# Altium footprint library PCB封装库.PcbLib: 77 footprints (part 2 of 5)
Each footprint in its own frame and in the unit in brackets; x right, y up, seen from the top. Pads: shape width x height; smd on the part's side, far side on the other; paste and mask are expansions set on the pad; w line width, h text height; cw(c..) or ccw(c..) is an arc to the next point about the centre after c.
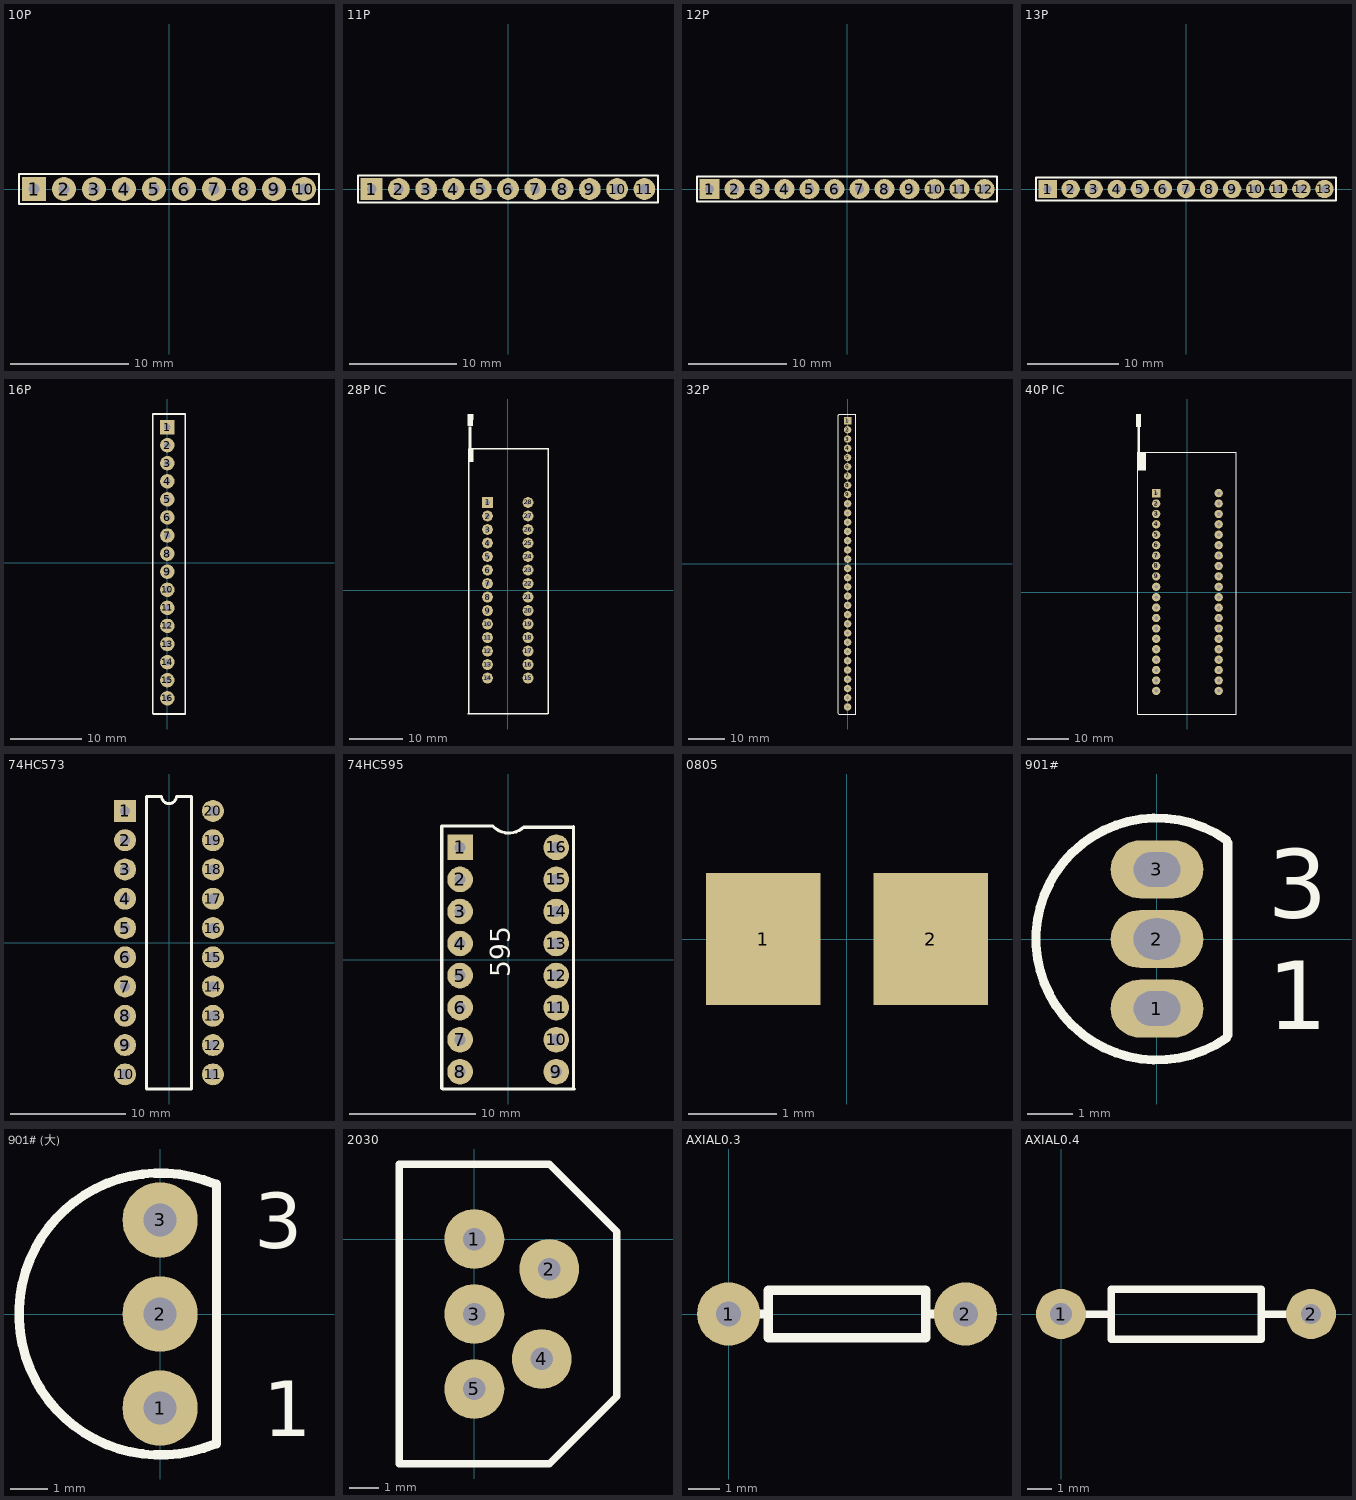
[diagram p1: the footprints below, top view; thin cyan lines are the x and y axes]

## 10P [mil]
pads (10):
  rect 80x80 hole 35.43: 1(-450,0)
  round 80 hole 35.43: 2(-350,0) 3(-250,0) 4(-150,0) 5(-50,0) 6(50,0) 7(150,0) 8(250,0) 9(350,0) 10(450,0)
Top Overlay:
  lines w7.87: -500,-50 -500,50 -425,50 500,50 500,-50 -500,-50

## 11P [mil]
pads (11):
  rect 80x80 hole 35.43: 1(-500,0)
  round 80 hole 35.43: 2(-400,0) 3(-300,0) 4(-200,0) 5(-100,0) 6(0,0) 7(100,0) 8(200,0) 9(300,0) 10(400,0) 11(500,0)
Top Overlay:
  lines w7.87: -550,-50 -550,50 -475,50 550,50 550,-50 -550,-50

## 12P [mil]
pads (12):
  rect 80x80 hole 35.43: 1(-550,0)
  round 80 hole 35.43: 2(-450,0) 3(-350,0) 4(-250,0) 5(-150,0) 6(-50,0) 7(50,0) 8(150,0) 9(250,0) 10(350,0) 11(450,0) 12(550,0)
Top Overlay:
  lines w7.87: -600,-50 -600,50 -525,50 600,50 600,-50 -600,-50

## 13P [mil]
pads (13):
  rect 80x80 hole 35.43: 1(-600,0)
  round 80 hole 35.43: 2(-500,0) 3(-400,0) 4(-300,0) 5(-200,0) 6(-100,0) 7(0,0) 8(100,0) 9(200,0) 10(300,0) 11(400,0) 12(500,0) 13(600,0)
Top Overlay:
  lines w7.87: -650,-50 -650,50 -575,50 650,50 650,-50 -650,-50

## 16P [mil]
pads (16):
  rect 80x80 hole 35: 1(0,750)
  round 80 hole 35: 2(0,650) 3(0,550) 4(0,450) 5(0,350) 6(0,250) 7(0,150) 8(0,50) 9(0,-50) 10(0,-150) 11(0,-250) 12(0,-350) 13(0,-450) 14(0,-550) 15(0,-650) 16(0,-750)
Top Overlay:
  lines w10: -81,-832 -76,-837 99,-837 99,822 -81,822 -81,-832

## 28P IC [mil]
pads (28):
  rect 80x80 hole 35: 1(-150,650)
  round 80 hole 35: 2(-150,550) 3(-150,450) 4(-150,350) 5(-150,250) 6(-150,150) 7(-150,50) 8(-150,-50) 9(-150,-150) 10(-150,-250) 11(-150,-350) 12(-150,-450) 13(-150,-550) 14(-150,-650) 15(150,-650) 16(150,-550) 17(150,-450) 18(150,-350) 19(150,-250) 20(150,-150) 21(150,-50) 22(150,50) 23(150,150) 24(150,250) 25(150,350) 26(150,450) 27(150,550) 28(150,650)
Top Overlay:
  rectangle: -276,951 -255,1049
  rectangle: -281,951 -276,1049
  rectangle: -276,1049 -268,1212
  rectangle: -289,1126 -276,1212
  rectangle: -289,1049 -276,1126
  region: -299.02,1215.5 -256.03,1215.01 -255,1305 -298,1305.49
  lines w10: -296,-916 295,-916 ; -289,-916 -289,1049 302,1049 ; 298,-916 298,1049

## 32P [mil]
pads (32):
  rect 80x80 hole 35: 1(0,1550)
  round 80 hole 35: 2(0,1450) 3(0,1350) 4(0,1250) 5(0,1150) 6(0,1050) 7(0,950) 8(0,850) 9(0,750) 10(0,650) 11(0,550) 12(0,450) 13(0,350) 14(0,250) 15(0,150) 16(0,50) 17(0,-50) 18(0,-150) 19(0,-250) 20(0,-350) 21(0,-450) 22(0,-550) 23(0,-650) 24(0,-750) 25(0,-850) 26(0,-950) 27(0,-1050) 28(0,-1150) 29(0,-1250) 30(0,-1350) 31(0,-1450) 32(0,-1550)
Top Overlay:
  lines w10: -103,-1619 -96,-1626 90,-1626 90,1621 -90,1621 -103,1608 -103,-1619

## 40P IC [mil]
pads (40):
  rect 80x80 hole 35: 1(-300,950)
  round 80 hole 35: 2(-300,850) 3(-300,750) 4(-300,650) 5(-300,550) 6(-300,450) 7(-300,350) 8(-300,250) 9(-300,150) 10(-300,50) 11(-300,-50) 12(-300,-150) 13(-300,-250) 14(-300,-350) 15(-300,-450) 16(-300,-550) 17(-300,-650) 18(-300,-750) 19(-300,-850) 20(-300,-950) 21(300,-950) 22(300,-850) 23(300,-750) 24(300,-650) 25(300,-550) 26(300,-450) 27(300,-350) 28(300,-250) 29(300,-150) 30(300,-50) 31(300,50) 32(300,150) 33(300,250) 34(300,350) 35(300,450) 36(300,550) 37(300,650) 38(300,750) 39(300,850) 40(300,950)
Top Overlay:
  rectangle: -494,1586 -445,1710
  rectangle: -480,1330 -455,1601
  rectangle: -475,1167 -396,1344
  lines w10: -475,-1172 -475,1344 467,1344 467,-1172 -475,-1172

## 74HC573 [mil]
pads (20):
  rect 75x75 hole 35: 1(-150,450)
  round 75 hole 35: 2(-150,350) 3(-150,250) 4(-150,150) 5(-150,50) 6(-150,-50) 7(-150,-150) 8(-150,-250) 9(-150,-350) 10(-150,-450) 11(150,-450) 12(150,-350) 13(150,-250) 14(150,-150) 15(150,-50) 16(150,50) 17(150,150) 18(150,250) 19(150,350) 20(150,450)
Top Overlay:
  lines w10: -77.5,-500 -77.5,500 -25,500 ccw(c0,500) 25,500 77.5,500 77.5,-500 -77.5,-500

## 74HC595 [mil]
pads (16):
  rect 80x80 hole 35: 1(-150,350)
  round 80 hole 35: 2(-150,250) 3(-150,150) 4(-150,50) 5(-150,-50) 6(-150,-150) 7(-150,-250) 8(-150,-350) 9(150,-350) 10(150,-250) 11(150,-150) 12(150,-50) 13(150,50) 14(150,150) 15(150,250) 16(150,350)
Top Overlay:
  lines w10: -208,417 -207,416 -207,-402 -205,-404 207,-404 204,-401 204,415 202,413 48,413 cw(c1.5,463.5) -49,417 -208,417
  text "595" at 5,-56 h60

## 0805 [mm]
pads (2):
  rect 1.3x1.5 smd: 1(-0.95,0) 2(0.95,0)

## 901# [mil]
pads (3):
  oval 80x50 hole 30 slot 40 at 0 deg: 1(0,-60) 3(0,60)
  oval 80x50 hole 35.43 slot 40 at 0 deg: 2(0,0)
Top Overlay:
  lines w7.87: 59.84,-85.46 cw(c0,0) 59.84,85.46 ; 61.02,-82.68 61.02,82.68
  text "3" at 95.31,18.39 h59.05
  text "1" at 95.31,-77.91 h59.05

## 901# (大) [mil]
pads (3):
  round 80 hole 35.43: 1(0,-100) 2(0,0) 3(0,100)
Top Overlay:
  lines w10: 58.58,-138.09 cw(c0,0) 58.58,138.09 ; 60,-138.09 60,138.09
  text "3" at 100,70 h59.05
  text "1" at 110,-130 h59.05

## 2030 [mil]
pads (5):
  round 80 hole 30: 1(0,0) 2(100,-40) 3(0,-100) 4(90,-160) 5(0,-200)
Top Overlay:
  lines w10: -100,-300 100,-300 190,-210 190,10 100,100 -100,100 -100,-300

## AXIAL0.3 [mil]
pads (2):
  round 80 hole 32: 1(0,0) 2(300,0)
Top Overlay:
  lines w12: 41,0 50,0 ; 259,0 250,0 ; 250,0 250,-30 50,-30 50,30 250,30 250,0

## AXIAL0.4 [mil]
pads (2):
  round 80 hole 35: 1(0,0)
  round 80 hole 32: 2(400,0)
Top Overlay:
  lines w12: 40,0 80,0 ; 320,0 360,0 ; 80,-40 80,40 320,40 320,-40 80,-40